# Altium footprint library mitosis.PcbLib: 14 footprints
Each footprint in its own frame and in the unit in brackets; x right, y up, seen from the top. Pads: shape width x height; smd on the part's side, far side on the other; paste and mask are expansions set on the pad; w line width, h text height; cw(c..) or ccw(c..) is an arc to the next point about the centre after c.
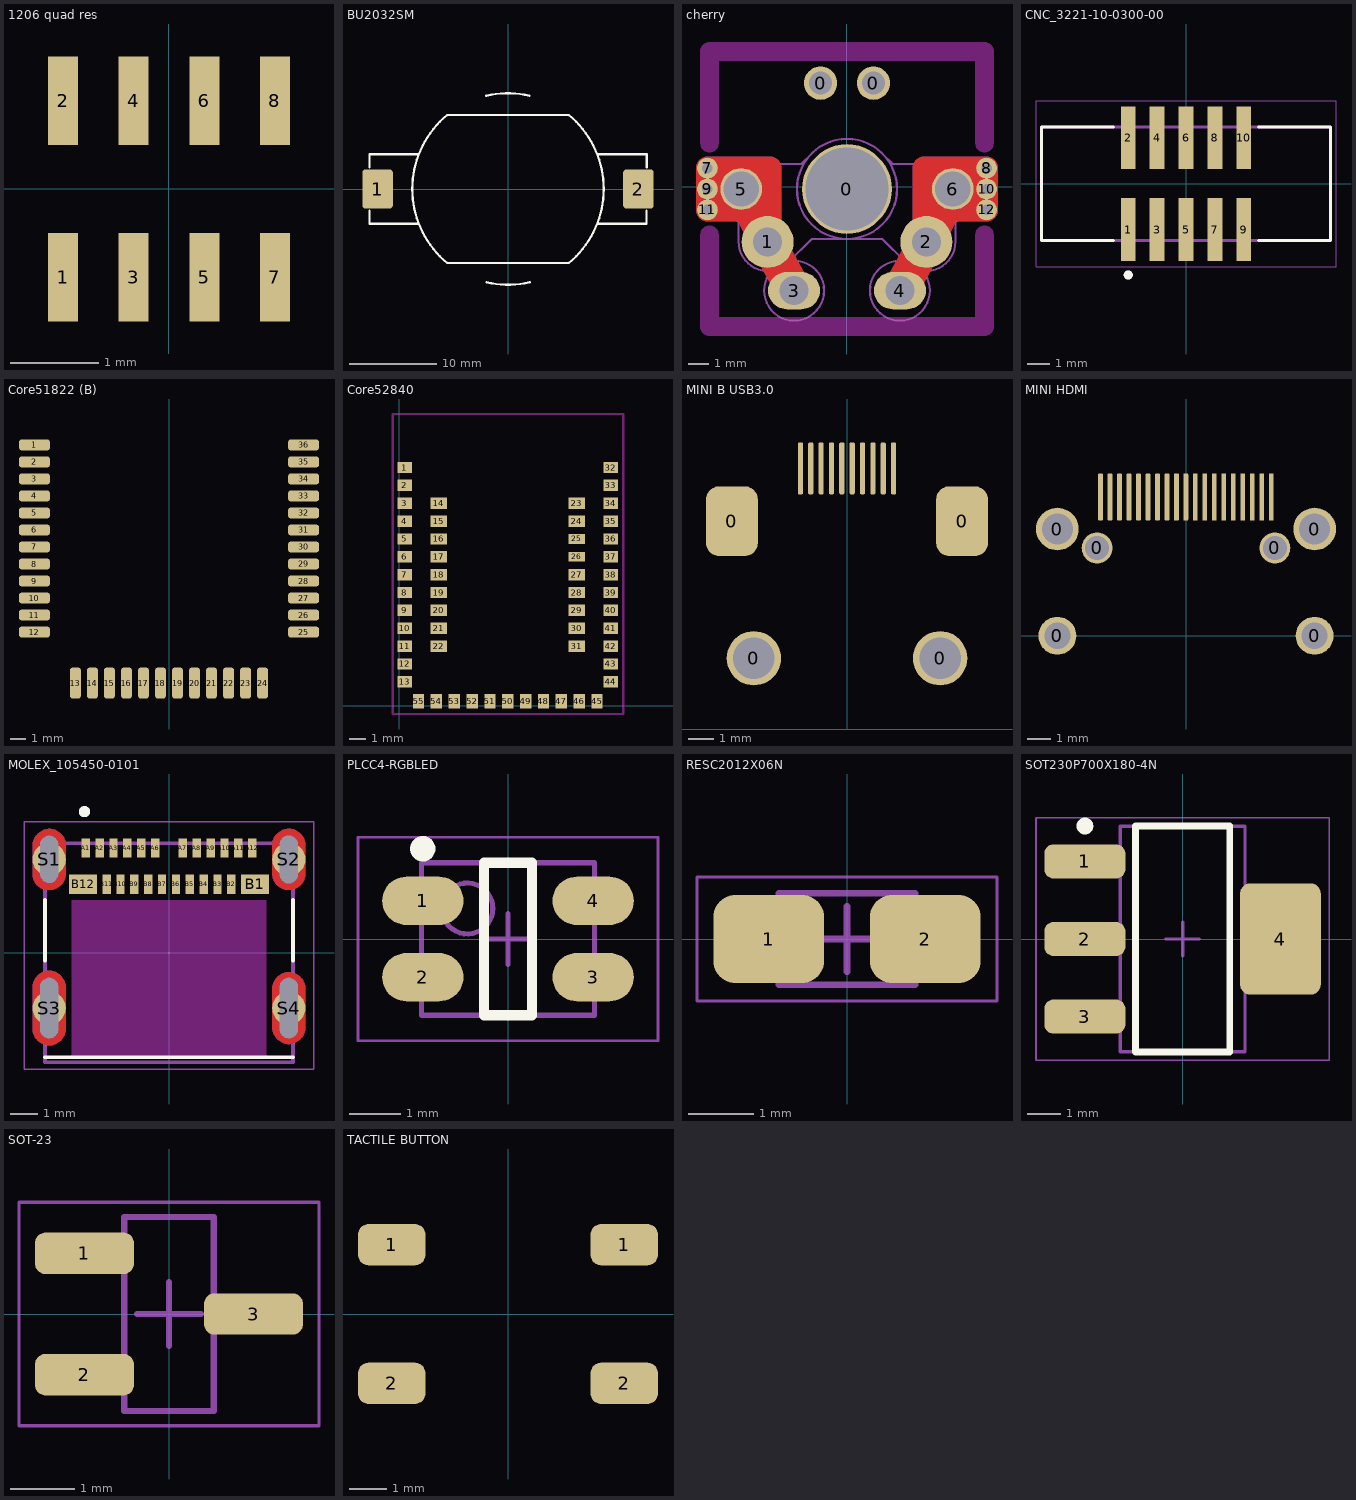
[diagram p0: the footprints below, top view; thin cyan lines are the x and y axes]

## 1206 quad res [mm]
pads (8):
  rect 0.34x1 smd: 1(-1.2,-1) 2(-1.2,1) 3(-0.4,-1) 4(-0.4,1) 5(0.4,-1) 6(0.4,1) 7(1.2,-1) 8(1.2,1)
3D body: height 1.1, standoff 0, extent -1.6,-0.8 1.6,0.8

## BU2032SM [mm] "Battery holder"
pads (2):
  rrect20% 3.5x4.5 smd paste-100: 1(-15,0) 2(15,0)
Top Overlay:
  lines w0.254: -15.93,-2.5 -15.93,-4 -10.287,-4 ; -15.93,2.5 -15.93,4 -10.287,4 ; -2.505,10.723 cw(c0,0) 2.483,10.728 ; -2.483,-10.728 ccw(c0,0) 2.505,-10.723 ; 10.287,-4 15.93,-4 15.93,-2.5 ; 10.287,4 15.95,4 15.95,2.5 ; -7,-8.5 cw(c0,0) -7,8.5 7,8.5 cw(c0,0) 7,-8.5 -7,-8.5
Top Paste:
  rectangle: 13.55,-2 14.87,-0.1
  rectangle: 13.55,0.1 14.87,2
  region: 16.45,2 15.13,2 15.13,0.1 16.45,0.1
  region: 16.45,-0.1 15.13,-0.1 15.13,-2 16.45,-2
  region: -13.55,2 -14.87,2 -14.87,0.1 -13.55,0.1
  region: -13.55,-0.1 -14.87,-0.1 -14.87,-2 -13.55,-2
  rectangle: -16.45,0.1 -15.13,2
  rectangle: -16.45,-2 -15.13,-0.1
3D body: height 4.6, standoff 0, extent -7,-8.5 7,8.5
3D body: height 4.7, standoff 1.5, extent -9.921,-9.98 10,9.98
3D body: height 4.6, standoff 0, extent -15.9,-4 15.9,4

## cherry [mm]
pads (15):
  round 1.6 hole 1.1: 0(-1.27,4.978) 0(1.27,4.978)
  round 4.3 hole 3.988: 0(0,-0.102)
  round 2.5 hole 1.4: 1(-3.81,-2.642) 2(3.81,-2.642)
  oval 2.5x1.8 hole 1.4: 3(-2.54,-4.978) 4(2.54,-4.978)
  round 2 hole 1.702: 5(-5.08,-0.102) 6(5.08,-0.102)
  round 1 hole 0.5 mask+0.05: 7(-6.7,0.898) 8(6.7,0.898) 9(-6.7,-0.102) 10(6.7,-0.102) 11(-6.7,-1.102) 12(6.7,-1.102)
Top Layer:
  lines w1.1: -6.7,-0.102 -5.08,-0.102 ; -4.3,-1.102 -6.7,-1.102 -6.7,0.898 -3.7,0.898 -3.7,-2.002 ; 3.7,-2.002 3.7,0.898 6.7,0.898 6.7,-1.102 4.3,-1.102 ; 5.08,-0.102 6.7,-0.102
  lines w1.7: -5.08,-0.102 -3.81,-2.642 -2.54,-4.978 ; 2.54,-4.978 3.81,-2.642 5.08,-0.102
Bottom Layer:
  lines w1.1: -6.7,-0.102 -5.08,-0.102 ; -4.3,-1.102 -6.7,-1.102 -6.7,0.898 -3.7,0.898 -3.7,-2.002 ; 3.7,-2.002 3.7,0.898 6.7,0.898 6.7,-1.102 4.3,-1.102 ; 5.08,-0.102 6.7,-0.102
  lines w1.7: -5.08,-0.102 -3.81,-2.642 -2.54,-4.978 ; 2.54,-4.978 3.81,-2.642 5.08,-0.102
Keep-Out Layer:
  board cut-out: -7,2.098 -7,6.498 -7,6.578 -6.939,6.725 -6.827,6.838 -6.68,6.898 -6.6,6.898 6.6,6.898 6.68,6.898 6.827,6.838 6.939,6.725 7,6.578 7,6.498 7,2.098 7,2.019 6.939,1.872 6.827,1.759 6.68,1.698 6.52,1.698 6.373,1.759 6.261,1.872 6.2,2.019 6.2,2.098 6.2,6.098 -6.2,6.098 -6.2,2.098 -6.2,2.019 -6.261,1.872 -6.373,1.759 -6.52,1.698 -6.68,1.698 -6.827,1.759 -6.939,1.872 -7,2.019
  board cut-out: -7,-2.302 -7,-6.702 -7,-6.781 -6.939,-6.928 -6.827,-7.041 -6.68,-7.102 -6.6,-7.102 6.6,-7.102 6.68,-7.102 6.827,-7.041 6.939,-6.928 7,-6.781 7,-6.702 7,-2.302 7,-2.222 6.939,-2.075 6.827,-1.962 6.68,-1.902 6.52,-1.902 6.373,-1.962 6.261,-2.075 6.2,-2.222 6.2,-2.302 6.2,-6.302 -6.2,-6.302 -6.2,-2.302 -6.2,-2.222 -6.261,-2.075 -6.373,-1.962 -6.52,-1.902 -6.68,-1.902 -6.827,-1.962 -6.939,-2.075 -7,-2.222
  text "CUTOUT" at -1.7,6.198 h0.6
  text "CUTOUT" at -1.7,-7.002 h0.6
Keep-Out Layer:
  lines w0.1: -7,-6.702 ccw(c-6.6,-6.702) -6.6,-7.102 6.6,-7.102 ccw(c6.6,-6.702) 7,-6.702 7,-2.302 ccw(c6.6,-2.302) 6.2,-2.302 6.2,-6.302 -6.2,-6.302 -6.2,-2.302 ccw(c-6.6,-2.302) -7,-2.302 -7,-6.702 ; -7,2.098 ccw(c-6.6,2.098) -6.2,2.098 -6.2,6.098 6.2,6.098 6.2,2.098 ccw(c6.6,2.098) 7,2.098 7,6.498 ccw(c6.6,6.498) 6.6,6.898 -6.6,6.898 ccw(c-6.6,6.498) -7,6.498 -7,2.098
Mechanical 3:
  circle w0.1: c-2.54,-4.978 r1.44
  circle w0.1: c-5.08,-0.102 r1.22
  lines w0.1: 0,-2.502 cw(c0,-0.099) 1.7,1.598 2.2,1.098 5.1,1.098 cw(c5.054,-0.122) 5.9,-1.002 5.2,-1.702 5.2,-2.62 cw(c3.808,-2.642) 2.8,-3.602 1.7,-2.502 0,-2.502
Mechanical 7:
  circle w0.1: c2.54,-4.978 r1.44
  circle w0.1: c5.08,-0.102 r1.22
  lines w0.1: -5.9,-1.002 cw(c-5.054,-0.122) -5.1,1.098 -2.2,1.098 -1.7,1.598 cw(c0,-0.099) 0,-2.502 -1.7,-2.502 -2.8,-3.602 cw(c-3.808,-2.642) -5.2,-2.62 -5.2,-1.702 -5.9,-1.002
3D body "white-keycap.step": height 23, standoff 11.5, extent -9,-9.102 9,8.898
3D body "switch.step": height 14.9, standoff -3, extent -7.82,-8.267 7.82,8.063
3D body "keycap.step": height 23, standoff 11.5, extent -9,-9.102 9,8.898
3D body "white-switch.step": height 14.9, standoff -3, extent -7.82,-8.267 7.82,8.063
3D body "black-keycap.step": height 23, standoff 11.5, extent -9,-9.102 9,8.898

## CNC_3221-10-0300-00 [mm]
pads (10):
  rect 0.65x2.76 smd: 1(-2.54,-2.02) 2(-2.54,2.02) 3(-1.27,-2.02) 4(-1.27,2.02) 5(0,-2.02) 6(0,2.02) 7(1.27,-2.02) 8(1.27,2.02) 9(2.54,-2.02) 10(2.54,2.02)
Top Overlay:
  circle w0.2: c-2.54,-4.019 r0.1
  lines w0.127: -3.185,-2.5 -6.35,-2.5 -6.35,2.5 -3.185,2.5 ; 3.185,-2.5 6.35,-2.5 6.35,2.5 3.185,2.5
Mechanical 13:
  circle w0.2: c-2.54,-4.019 r0.1
  lines w0.127: -6.35,-2.5 -6.35,2.5 6.35,2.5 6.35,-2.5 -6.35,-2.5
Mechanical 15:
  lines w0.05: -6.6,-3.65 -6.6,3.65 6.6,3.65 6.6,-3.65 -6.6,-3.65

## Core51822 (B) [mm]
pads (36):
  rrect50% 2x0.7 smd: 1(-8.7,-5.6) 2(-8.7,-6.7) 3(-8.7,-7.8) 4(-8.7,-8.9) 5(-8.7,-10) 6(-8.7,-11.1) 7(-8.7,-12.2) 8(-8.7,-13.3) 9(-8.7,-14.4) 10(-8.7,-15.5) 11(-8.7,-16.6) 12(-8.7,-17.7) 25(8.7,-17.7) 26(8.7,-16.6) 27(8.7,-15.5) 28(8.7,-14.4) 29(8.7,-13.3) 30(8.7,-12.2) 31(8.7,-11.1) 32(8.7,-10) 33(8.7,-8.9) 34(8.7,-7.8) 35(8.7,-6.7) 36(8.7,-5.6)
  rrect50% 0.7x2 smd: 13(-6.05,-21) 14(-4.95,-21) 15(-3.85,-21) 16(-2.75,-21) 17(-1.65,-21) 18(-0.55,-21) 19(0.55,-21) 20(1.65,-21) 21(2.75,-21) 22(3.85,-21) 23(4.95,-21) 24(6.05,-21)
3D body: height 1.8, standoff 1, extent -2.3,-13.8 3.7,-7.8
3D body: height 1, standoff 0, extent -8.5,-20.8 8.5,0

## Core52840 [mm]
pads (55):
  rect 0.9x0.7 smd: 1(0.337,14.684) 2(0.337,13.584) 3(0.337,12.484) 4(0.337,11.384) 5(0.337,10.284) 6(0.337,9.184) 7(0.337,8.084) 8(0.337,6.984) 9(0.337,5.884) 10(0.337,4.784) 11(0.337,3.684) 12(0.337,2.584) 13(0.337,1.484) 32(13.037,14.684) 33(13.037,13.584) 34(13.037,12.484) 35(13.037,11.384) 36(13.037,10.284) 37(13.037,9.184) 38(13.037,8.084) 39(13.037,6.984) 40(13.037,5.884) 41(13.037,4.784) 42(13.037,3.684) 43(13.037,2.584) 44(13.037,1.484)
  rect 1x0.7 smd: 14(2.437,12.484) 15(2.437,11.384) 16(2.437,10.284) 17(2.437,9.184) 18(2.437,8.084) 19(2.437,6.984) 20(2.437,5.884) 21(2.437,4.784) 22(2.437,3.684) 23(10.937,12.484) 24(10.937,11.384) 27(10.937,8.084) 28(10.937,6.984) 29(10.937,5.884) 30(10.937,4.784) 31(10.937,3.684)
  rect 1x0.6 smd: 25(10.937,10.284) 26(10.937,9.184)
  rect 0.7x0.9 smd: 45(12.187,0.284) 46(11.087,0.284) 47(9.987,0.284) 48(8.887,0.284) 49(7.787,0.284) 50(6.687,0.284) 51(5.587,0.284) 52(4.487,0.284) 53(3.387,0.284) 54(2.287,0.284) 55(1.187,0.284)
Top Solder:
  rectangle: 12.052,9.934 12.582,15.354
  rectangle: 3.397,14.894 12.582,15.354
  rectangle: 0.797,0.774 10.827,1.214
  rectangle: 0.797,14.889 2.467,15.339
  rectangle: 0.797,0.774 1.232,15.244
Keep-Out Layer:
  lines w0.127: -0.4,-0.5 -0.4,17.984 13.8,17.984 13.8,-0.5 -0.4,-0.5

## MINI B USB3.0 [mm] "USB2070"
pads (14):
  rrect50% 2x2.7 smd mask+0.05: 0(-4.45,8.05) 0(4.45,8.05)
  round 2.1 hole 1.6: 0(-3.6,2.75) 0(3.6,2.75)
  rrect50% 0.2x2 smd mask+0.05: 1(-1.8,10.09) 2(-1.4,10.09) 3(-1,10.09) 4(-0.6,10.09) 5(-0.2,10.09) 6(0.2,10.09) 7(0.6,10.09) 8(1,10.09) 9(1.4,10.09) 10(1.8,10.09)
3D body "miniusb.step": height 3.75, standoff -0.65, extent -4.85,0 4.85,9.9

## MINI HDMI [mm]
pads (25):
  round 1.6 hole 1.1: 0(-5.425,0) 0(5.425,0)
  round 1.8 hole 1.3: 0(-5.425,4.5) 0(5.425,4.5)
  round 1.3 hole 1 mask+0.05: 0(-3.75,3.7) 0(3.75,3.7)
  rrect50% 0.2x2 smd mask+0.05: 1(3.595,5.85) 2(3.195,5.85) 3(2.795,5.85) 4(2.395,5.85) 5(1.995,5.85) 6(1.595,5.85) 7(1.195,5.85) 8(0.795,5.85) 9(0.395,5.85) 10(-0.005,5.85) 11(-0.405,5.85) 12(-0.805,5.85) 13(-1.205,5.85) 14(-1.605,5.85) 15(-2.005,5.85) 16(-2.405,5.85) 17(-2.805,5.85) 18(-3.205,5.85) 19(-3.605,5.85)
3D body "Download_STP_685119136923.stp": height 3.3, standoff -2.15, extent -5.625,-2 5.625,5.902

## MOLEX_105450-0101 [mm]
pads (28):
  rect 0.3x0.7 smd: A1(-3,3.77) A2(-2.5,3.77) A3(-2,3.77) A4(-1.5,3.77) A5(-1,3.77) A6(-0.5,3.77) A7(0.5,3.77) A8(1,3.77) A9(1.5,3.77) A10(2,3.77) A11(2.5,3.77) A12(3,3.77) B2(2.25,2.47) B3(1.75,2.47) B4(1.25,2.47) B5(0.75,2.47) B6(0.25,2.47) B7(-0.25,2.47) B8(-0.75,2.47) B9(-1.25,2.47) B10(-1.75,2.47) B11(-2.25,2.47)
  rect 1x0.7 smd: B1(3.1,2.47) B12(-3.1,2.47)
  round 1.2 hole 0.65 slot 1.7 at 90 deg mask+0: S1(-4.32,3.36)
  round 1.2 hole 0.65 slot 1.725 at 90 deg mask+0: S2(4.32,3.36)
  round 1.2 hole 0.65 slot 2.175 at 90 deg mask+0: S3(-4.32,-2) S4(4.32,-2)
Top Layer:
  region: 4.35,-0.702 4.382,-0.706 4.414,-0.711 4.446,-0.718 4.478,-0.727 4.509,-0.737 4.539,-0.749 4.569,-0.763 4.598,-0.778 4.626,-0.795 4.654,-0.813 4.68,-0.832 4.705,-0.853 4.73,-0.875 4.752,-0.898 4.774,-0.923 4.795,-0.949 4.814,-0.975 4.831,-1.003 4.847,-1.031 4.862,-1.061 4.875,-1.091 4.886,-1.121 4.896,-1.153 4.904,-1.184 4.911,-1.216 4.916,-1.249 4.919,-1.281 4.92,-1.314 4.92,-1.35 4.92,-2.65 4.92,-2.686 4.919,-2.719 4.916,-2.751 4.911,-2.784 4.904,-2.816 4.896,-2.847 4.886,-2.879 4.875,-2.909 4.862,-2.939 4.847,-2.969 4.831,-2.997 4.814,-3.025 4.795,-3.051 4.774,-3.077 4.752,-3.102 4.73,-3.125 4.705,-3.147 4.68,-3.168 4.654,-3.187 4.626,-3.205 4.598,-3.222 4.569,-3.237 4.539,-3.251 4.509,-3.263 4.478,-3.273 4.446,-3.282 4.414,-3.289 4.382,-3.294 4.35,-3.298 4.32,-3.3 4.29,-3.298 4.258,-3.294 4.226,-3.289 4.194,-3.282 4.162,-3.273 4.131,-3.263 4.101,-3.251 4.071,-3.237 4.042,-3.222 4.014,-3.205 3.986,-3.187 3.96,-3.168 3.935,-3.147 3.91,-3.125 3.888,-3.102 3.866,-3.077 3.845,-3.051 3.826,-3.025 3.809,-2.997 3.793,-2.969 3.778,-2.939 3.765,-2.909 3.754,-2.879 3.744,-2.847 3.736,-2.816 3.729,-2.784 3.724,-2.751 3.721,-2.719 3.72,-2.686 3.72,-2.65 3.72,-1.35 3.72,-1.314 3.721,-1.281 3.724,-1.249 3.729,-1.216 3.736,-1.184 3.744,-1.153 3.754,-1.121 3.765,-1.091 3.778,-1.061 3.793,-1.031 3.809,-1.003 3.826,-0.975 3.845,-0.949 3.866,-0.923 3.888,-0.898 3.91,-0.875 3.935,-0.853 3.96,-0.832 3.986,-0.813 4.014,-0.795 4.042,-0.778 4.071,-0.763 4.101,-0.749 4.131,-0.737 4.162,-0.727 4.194,-0.718 4.226,-0.711 4.258,-0.706 4.29,-0.702 4.32,-0.7
  region: -4.29,-0.652 -4.258,-0.656 -4.226,-0.661 -4.194,-0.668 -4.162,-0.677 -4.131,-0.687 -4.101,-0.699 -4.071,-0.713 -4.042,-0.728 -4.014,-0.745 -3.986,-0.763 -3.96,-0.782 -3.935,-0.803 -3.91,-0.825 -3.888,-0.848 -3.866,-0.873 -3.845,-0.899 -3.826,-0.925 -3.809,-0.953 -3.793,-0.981 -3.778,-1.011 -3.765,-1.041 -3.754,-1.071 -3.744,-1.103 -3.736,-1.134 -3.729,-1.166 -3.724,-1.199 -3.721,-1.231 -3.72,-1.264 -3.72,-1.3 -3.72,-2.7 -3.72,-2.736 -3.721,-2.769 -3.724,-2.801 -3.729,-2.834 -3.736,-2.866 -3.744,-2.897 -3.754,-2.929 -3.765,-2.959 -3.778,-2.989 -3.793,-3.019 -3.809,-3.047 -3.826,-3.075 -3.845,-3.101 -3.866,-3.127 -3.888,-3.152 -3.91,-3.175 -3.935,-3.197 -3.96,-3.218 -3.986,-3.237 -4.014,-3.255 -4.042,-3.272 -4.071,-3.287 -4.101,-3.301 -4.131,-3.313 -4.162,-3.323 -4.194,-3.332 -4.226,-3.339 -4.258,-3.344 -4.29,-3.348 -4.32,-3.35 -4.35,-3.348 -4.382,-3.344 -4.414,-3.339 -4.446,-3.332 -4.478,-3.323 -4.509,-3.313 -4.539,-3.301 -4.569,-3.287 -4.598,-3.272 -4.626,-3.255 -4.654,-3.237 -4.68,-3.218 -4.705,-3.197 -4.73,-3.175 -4.752,-3.152 -4.774,-3.127 -4.795,-3.101 -4.814,-3.075 -4.831,-3.047 -4.847,-3.019 -4.862,-2.989 -4.875,-2.959 -4.886,-2.929 -4.896,-2.897 -4.904,-2.866 -4.911,-2.834 -4.916,-2.801 -4.919,-2.769 -4.92,-2.736 -4.92,-2.7 -4.92,-1.3 -4.92,-1.264 -4.919,-1.231 -4.916,-1.199 -4.911,-1.166 -4.904,-1.134 -4.896,-1.103 -4.886,-1.071 -4.875,-1.041 -4.862,-1.011 -4.847,-0.981 -4.831,-0.953 -4.814,-0.925 -4.795,-0.899 -4.774,-0.873 -4.752,-0.848 -4.73,-0.825 -4.705,-0.803 -4.68,-0.782 -4.654,-0.763 -4.626,-0.745 -4.598,-0.728 -4.569,-0.713 -4.539,-0.699 -4.509,-0.687 -4.478,-0.677 -4.446,-0.668 -4.414,-0.661 -4.382,-0.656 -4.35,-0.652 -4.32,-0.65
  region: 4.351,4.459 4.383,4.457 4.414,4.453 4.445,4.447 4.475,4.44 4.505,4.431 4.535,4.42 4.564,4.408 4.592,4.395 4.62,4.38 4.647,4.363 4.673,4.345 4.698,4.326 4.721,4.306 4.744,4.284 4.766,4.261 4.786,4.238 4.805,4.213 4.823,4.187 4.84,4.16 4.855,4.132 4.868,4.104 4.88,4.075 4.891,4.045 4.9,4.015 4.907,3.985 4.913,3.954 4.917,3.923 4.919,3.891 4.92,3.86 4.92,2.86 4.919,2.829 4.917,2.797 4.913,2.766 4.907,2.735 4.9,2.705 4.891,2.675 4.88,2.645 4.868,2.616 4.855,2.588 4.84,2.56 4.823,2.533 4.805,2.507 4.786,2.482 4.766,2.459 4.744,2.436 4.721,2.414 4.698,2.394 4.673,2.375 4.647,2.357 4.62,2.34 4.592,2.325 4.564,2.312 4.535,2.3 4.505,2.289 4.475,2.28 4.445,2.273 4.414,2.267 4.383,2.263 4.351,2.261 4.32,2.26 4.289,2.261 4.257,2.263 4.226,2.267 4.195,2.273 4.165,2.28 4.135,2.289 4.105,2.3 4.076,2.312 4.048,2.325 4.02,2.34 3.993,2.357 3.967,2.375 3.942,2.394 3.919,2.414 3.896,2.436 3.874,2.459 3.854,2.482 3.835,2.507 3.817,2.533 3.8,2.56 3.785,2.588 3.772,2.616 3.76,2.645 3.749,2.675 3.74,2.705 3.733,2.735 3.727,2.766 3.723,2.797 3.721,2.829 3.72,2.86 3.72,3.86 3.721,3.891 3.723,3.923 3.727,3.954 3.733,3.985 3.74,4.015 3.749,4.045 3.76,4.075 3.772,4.104 3.785,4.132 3.8,4.16 3.817,4.187 3.835,4.213 3.854,4.238 3.874,4.261 3.896,4.284 3.919,4.306 3.942,4.326 3.967,4.345 3.993,4.363 4.02,4.38 4.048,4.395 4.076,4.408 4.105,4.42 4.135,4.431 4.165,4.44 4.195,4.447 4.226,4.453 4.257,4.457 4.289,4.459 4.32,4.46
  region: -4.289,4.459 -4.257,4.457 -4.226,4.453 -4.195,4.447 -4.165,4.44 -4.135,4.431 -4.105,4.42 -4.076,4.408 -4.048,4.395 -4.02,4.38 -3.993,4.363 -3.967,4.345 -3.942,4.326 -3.919,4.306 -3.896,4.284 -3.874,4.261 -3.854,4.238 -3.835,4.213 -3.817,4.187 -3.8,4.16 -3.785,4.132 -3.772,4.104 -3.76,4.075 -3.749,4.045 -3.74,4.015 -3.733,3.985 -3.727,3.954 -3.723,3.923 -3.721,3.891 -3.72,3.86 -3.72,2.86 -3.721,2.829 -3.723,2.797 -3.727,2.766 -3.733,2.735 -3.74,2.705 -3.749,2.675 -3.76,2.645 -3.772,2.616 -3.785,2.588 -3.8,2.56 -3.817,2.533 -3.835,2.507 -3.854,2.482 -3.874,2.459 -3.896,2.436 -3.919,2.414 -3.942,2.394 -3.967,2.375 -3.993,2.357 -4.02,2.34 -4.048,2.325 -4.076,2.312 -4.105,2.3 -4.135,2.289 -4.165,2.28 -4.195,2.273 -4.226,2.267 -4.257,2.263 -4.289,2.261 -4.32,2.26 -4.355,2.26 -4.385,2.261 -4.415,2.264 -4.445,2.268 -4.474,2.274 -4.504,2.282 -4.532,2.291 -4.561,2.301 -4.588,2.313 -4.615,2.327 -4.641,2.342 -4.667,2.358 -4.691,2.375 -4.715,2.394 -4.738,2.414 -4.759,2.435 -4.779,2.457 -4.799,2.481 -4.816,2.505 -4.833,2.53 -4.848,2.556 -4.862,2.583 -4.875,2.61 -4.886,2.638 -4.895,2.667 -4.903,2.696 -4.91,2.725 -4.915,2.755 -4.918,2.785 -4.92,2.81 -4.92,3.81 -4.92,3.846 -4.919,3.879 -4.916,3.911 -4.911,3.944 -4.904,3.976 -4.896,4.007 -4.886,4.039 -4.875,4.069 -4.862,4.099 -4.847,4.129 -4.831,4.157 -4.814,4.185 -4.795,4.211 -4.774,4.237 -4.752,4.262 -4.73,4.285 -4.705,4.307 -4.68,4.328 -4.654,4.347 -4.626,4.365 -4.598,4.382 -4.569,4.397 -4.539,4.411 -4.509,4.423 -4.478,4.433 -4.446,4.442 -4.414,4.449 -4.382,4.454 -4.35,4.458 -4.32,4.46
Bottom Layer:
  region: 4.35,-0.702 4.382,-0.706 4.414,-0.711 4.446,-0.718 4.478,-0.727 4.509,-0.737 4.539,-0.749 4.569,-0.763 4.598,-0.778 4.626,-0.795 4.654,-0.813 4.68,-0.832 4.705,-0.853 4.73,-0.875 4.752,-0.898 4.774,-0.923 4.795,-0.949 4.814,-0.975 4.831,-1.003 4.847,-1.031 4.862,-1.061 4.875,-1.091 4.886,-1.121 4.896,-1.153 4.904,-1.184 4.911,-1.216 4.916,-1.249 4.919,-1.281 4.92,-1.314 4.92,-1.35 4.92,-2.65 4.92,-2.686 4.919,-2.719 4.916,-2.751 4.911,-2.784 4.904,-2.816 4.896,-2.847 4.886,-2.879 4.875,-2.909 4.862,-2.939 4.847,-2.969 4.831,-2.997 4.814,-3.025 4.795,-3.051 4.774,-3.077 4.752,-3.102 4.73,-3.125 4.705,-3.147 4.68,-3.168 4.654,-3.187 4.626,-3.205 4.598,-3.222 4.569,-3.237 4.539,-3.251 4.509,-3.263 4.478,-3.273 4.446,-3.282 4.414,-3.289 4.382,-3.294 4.35,-3.298 4.32,-3.3 4.29,-3.298 4.258,-3.294 4.226,-3.289 4.194,-3.282 4.162,-3.273 4.131,-3.263 4.101,-3.251 4.071,-3.237 4.042,-3.222 4.014,-3.205 3.986,-3.187 3.96,-3.168 3.935,-3.147 3.91,-3.125 3.888,-3.102 3.866,-3.077 3.845,-3.051 3.826,-3.025 3.809,-2.997 3.793,-2.969 3.778,-2.939 3.765,-2.909 3.754,-2.879 3.744,-2.847 3.736,-2.816 3.729,-2.784 3.724,-2.751 3.721,-2.719 3.72,-2.686 3.72,-2.65 3.72,-1.35 3.72,-1.314 3.721,-1.281 3.724,-1.249 3.729,-1.216 3.736,-1.184 3.744,-1.153 3.754,-1.121 3.765,-1.091 3.778,-1.061 3.793,-1.031 3.809,-1.003 3.826,-0.975 3.845,-0.949 3.866,-0.923 3.888,-0.898 3.91,-0.875 3.935,-0.853 3.96,-0.832 3.986,-0.813 4.014,-0.795 4.042,-0.778 4.071,-0.763 4.101,-0.749 4.131,-0.737 4.162,-0.727 4.194,-0.718 4.226,-0.711 4.258,-0.706 4.29,-0.702 4.32,-0.7
  region: -4.29,-0.652 -4.258,-0.656 -4.226,-0.661 -4.194,-0.668 -4.162,-0.677 -4.131,-0.687 -4.101,-0.699 -4.071,-0.713 -4.042,-0.728 -4.014,-0.745 -3.986,-0.763 -3.96,-0.782 -3.935,-0.803 -3.91,-0.825 -3.888,-0.848 -3.866,-0.873 -3.845,-0.899 -3.826,-0.925 -3.809,-0.953 -3.793,-0.981 -3.778,-1.011 -3.765,-1.041 -3.754,-1.071 -3.744,-1.103 -3.736,-1.134 -3.729,-1.166 -3.724,-1.199 -3.721,-1.231 -3.72,-1.264 -3.72,-1.3 -3.72,-2.7 -3.72,-2.736 -3.721,-2.769 -3.724,-2.801 -3.729,-2.834 -3.736,-2.866 -3.744,-2.897 -3.754,-2.929 -3.765,-2.959 -3.778,-2.989 -3.793,-3.019 -3.809,-3.047 -3.826,-3.075 -3.845,-3.101 -3.866,-3.127 -3.888,-3.152 -3.91,-3.175 -3.935,-3.197 -3.96,-3.218 -3.986,-3.237 -4.014,-3.255 -4.042,-3.272 -4.071,-3.287 -4.101,-3.301 -4.131,-3.313 -4.162,-3.323 -4.194,-3.332 -4.226,-3.339 -4.258,-3.344 -4.29,-3.348 -4.32,-3.35 -4.35,-3.348 -4.382,-3.344 -4.414,-3.339 -4.446,-3.332 -4.478,-3.323 -4.509,-3.313 -4.539,-3.301 -4.569,-3.287 -4.598,-3.272 -4.626,-3.255 -4.654,-3.237 -4.68,-3.218 -4.705,-3.197 -4.73,-3.175 -4.752,-3.152 -4.774,-3.127 -4.795,-3.101 -4.814,-3.075 -4.831,-3.047 -4.847,-3.019 -4.862,-2.989 -4.875,-2.959 -4.886,-2.929 -4.896,-2.897 -4.904,-2.866 -4.911,-2.834 -4.916,-2.801 -4.919,-2.769 -4.92,-2.736 -4.92,-2.7 -4.92,-1.3 -4.92,-1.264 -4.919,-1.231 -4.916,-1.199 -4.911,-1.166 -4.904,-1.134 -4.896,-1.103 -4.886,-1.071 -4.875,-1.041 -4.862,-1.011 -4.847,-0.981 -4.831,-0.953 -4.814,-0.925 -4.795,-0.899 -4.774,-0.873 -4.752,-0.848 -4.73,-0.825 -4.705,-0.803 -4.68,-0.782 -4.654,-0.763 -4.626,-0.745 -4.598,-0.728 -4.569,-0.713 -4.539,-0.699 -4.509,-0.687 -4.478,-0.677 -4.446,-0.668 -4.414,-0.661 -4.382,-0.656 -4.35,-0.652 -4.32,-0.65
  region: 4.351,4.459 4.383,4.457 4.414,4.453 4.445,4.447 4.475,4.44 4.505,4.431 4.535,4.42 4.564,4.408 4.592,4.395 4.62,4.38 4.647,4.363 4.673,4.345 4.698,4.326 4.721,4.306 4.744,4.284 4.766,4.261 4.786,4.238 4.805,4.213 4.823,4.187 4.84,4.16 4.855,4.132 4.868,4.104 4.88,4.075 4.891,4.045 4.9,4.015 4.907,3.985 4.913,3.954 4.917,3.923 4.919,3.891 4.92,3.86 4.92,2.86 4.919,2.829 4.917,2.797 4.913,2.766 4.907,2.735 4.9,2.705 4.891,2.675 4.88,2.645 4.868,2.616 4.855,2.588 4.84,2.56 4.823,2.533 4.805,2.507 4.786,2.482 4.766,2.459 4.744,2.436 4.721,2.414 4.698,2.394 4.673,2.375 4.647,2.357 4.62,2.34 4.592,2.325 4.564,2.312 4.535,2.3 4.505,2.289 4.475,2.28 4.445,2.273 4.414,2.267 4.383,2.263 4.351,2.261 4.32,2.26 4.289,2.261 4.257,2.263 4.226,2.267 4.195,2.273 4.165,2.28 4.135,2.289 4.105,2.3 4.076,2.312 4.048,2.325 4.02,2.34 3.993,2.357 3.967,2.375 3.942,2.394 3.919,2.414 3.896,2.436 3.874,2.459 3.854,2.482 3.835,2.507 3.817,2.533 3.8,2.56 3.785,2.588 3.772,2.616 3.76,2.645 3.749,2.675 3.74,2.705 3.733,2.735 3.727,2.766 3.723,2.797 3.721,2.829 3.72,2.86 3.72,3.86 3.721,3.891 3.723,3.923 3.727,3.954 3.733,3.985 3.74,4.015 3.749,4.045 3.76,4.075 3.772,4.104 3.785,4.132 3.8,4.16 3.817,4.187 3.835,4.213 3.854,4.238 3.874,4.261 3.896,4.284 3.919,4.306 3.942,4.326 3.967,4.345 3.993,4.363 4.02,4.38 4.048,4.395 4.076,4.408 4.105,4.42 4.135,4.431 4.165,4.44 4.195,4.447 4.226,4.453 4.257,4.457 4.289,4.459 4.32,4.46
  region: -4.289,4.459 -4.257,4.457 -4.226,4.453 -4.195,4.447 -4.165,4.44 -4.135,4.431 -4.105,4.42 -4.076,4.408 -4.048,4.395 -4.02,4.38 -3.993,4.363 -3.967,4.345 -3.942,4.326 -3.919,4.306 -3.896,4.284 -3.874,4.261 -3.854,4.238 -3.835,4.213 -3.817,4.187 -3.8,4.16 -3.785,4.132 -3.772,4.104 -3.76,4.075 -3.749,4.045 -3.74,4.015 -3.733,3.985 -3.727,3.954 -3.723,3.923 -3.721,3.891 -3.72,3.86 -3.72,2.86 -3.721,2.829 -3.723,2.797 -3.727,2.766 -3.733,2.735 -3.74,2.705 -3.749,2.675 -3.76,2.645 -3.772,2.616 -3.785,2.588 -3.8,2.56 -3.817,2.533 -3.835,2.507 -3.854,2.482 -3.874,2.459 -3.896,2.436 -3.919,2.414 -3.942,2.394 -3.967,2.375 -3.993,2.357 -4.02,2.34 -4.048,2.325 -4.076,2.312 -4.105,2.3 -4.135,2.289 -4.165,2.28 -4.195,2.273 -4.226,2.267 -4.257,2.263 -4.289,2.261 -4.32,2.26 -4.355,2.26 -4.385,2.261 -4.415,2.264 -4.445,2.268 -4.474,2.274 -4.504,2.282 -4.532,2.291 -4.561,2.301 -4.588,2.313 -4.615,2.327 -4.641,2.342 -4.667,2.358 -4.691,2.375 -4.715,2.394 -4.738,2.414 -4.759,2.435 -4.779,2.457 -4.799,2.481 -4.816,2.505 -4.833,2.53 -4.848,2.556 -4.862,2.583 -4.875,2.61 -4.886,2.638 -4.895,2.667 -4.903,2.696 -4.91,2.725 -4.915,2.755 -4.918,2.785 -4.92,2.81 -4.92,3.81 -4.92,3.846 -4.919,3.879 -4.916,3.911 -4.911,3.944 -4.904,3.976 -4.896,4.007 -4.886,4.039 -4.875,4.069 -4.862,4.099 -4.847,4.129 -4.831,4.157 -4.814,4.185 -4.795,4.211 -4.774,4.237 -4.752,4.262 -4.73,4.285 -4.705,4.307 -4.68,4.328 -4.654,4.347 -4.626,4.365 -4.598,4.382 -4.569,4.397 -4.539,4.411 -4.509,4.423 -4.478,4.433 -4.446,4.442 -4.414,4.449 -4.382,4.454 -4.35,4.458 -4.32,4.46
Top Overlay:
  circle w0.2: c-3.048,5.08 r0.1
  lines w0.127: -4.47,-3.77 4.47,-3.77 ; -4.47,-0.3 -4.47,1.9 ; 4.47,-0.3 4.47,1.9
Top Solder:
  drawing of 4 lines, arcs and shapes, not listed
Bottom Solder:
  drawing of 4 lines, arcs and shapes, not listed
Keep-Out Layer:
  region: 3.5,-3.77 -3.5,-3.77 -3.5,1.88 3.5,1.88
Mechanical 13:
  circle w0.2: c-3.048,5.08 r0.1
  lines w0.127: -4.47,-3.95 -4.47,3.95 4.47,3.95 4.47,-3.95 -4.47,-3.95
Mechanical 15:
  lines w0.05: -5.22,-4.2 -5.22,4.71 5.22,4.71 5.22,-4.2 -5.22,-4.2
3D body "1054500101--3DModel-STEP-1.STEP": height 3.2, standoff -0.9, extent -4.47,-3.905 4.47,3.995

## PLCC4-RGBLED [mm]
height 2.1
pads (4):
  oval 1.6x0.95 smd: 1(-1.675,0.75) 2(-1.675,-0.75) 3(1.675,-0.75) 4(1.675,0.75)
Top Overlay:
  circle w0.25: c-1.675,1.775 r0.125
  lines w0.2: -0.475,-1.5 0.475,-1.5 0.475,1.5 -0.475,1.5 -0.475,-1.5
Mechanical 13:
  circle w0.1: c-0.8,0.6 r0.5
  lines w0.1: -1.7,-1.5 1.7,-1.5 1.7,1.5 -1.7,1.5 -1.7,-1.5
Mechanical 15:
  lines w0.05: -2.95,-2 2.95,-2 2.95,2 -2.95,2 -2.95,-2
  lines w0.1: -0.5,0 0.5,0 ; 0,-0.5 0,0.5
3D body: height 2.1, standoff 0, extent -1.7,-1.5 1.7,1.5
3D body: height 2.2, standoff 0, extent -0.992,-0.998 1,0.998

## RESC2012X06N [mm] "Chip Resistor, 2-Leads, Body 2.00x1.25mm, IPC Medium Density"
height 0.55
pads (2):
  rrect50% 1.7x1.35 smd: 1(-1.2,0) 2(1.2,0)
Mechanical 13:
  lines w0.1: -1.05,-0.7 1.05,-0.7 1.05,0.7 -1.05,0.7 -1.05,-0.7
Mechanical 15:
  lines w0.05: -2.3,-0.95 2.3,-0.95 2.3,0.95 -2.3,0.95 -2.3,-0.95
  lines w0.1: -0.5,0 0.5,0 ; 0,-0.5 0,0.5
3D body: height 0.55, standoff 0, extent 0.6,-0.7 1.05,0.7
3D body: height 0.55, standoff 0, extent -1.05,-0.7 -0.6,0.7
3D body: height 0.55, standoff 0, extent -0.6,-0.7 0.6,0.7

## SOT230P700X180-4N [mm] "SOT223, 4-Leads, Body 6.50x7.00mm (avg), Pitch 2.30mm, IPC Medium Density"
height 1.8
pads (4):
  rrect50% 2.4x1 smd: 1(-2.9,2.3) 2(-2.9,0) 3(-2.9,-2.3)
  rrect25% 2.4x3.3 smd: 4(2.9,0)
Top Overlay:
  circle w0.25: c-2.9,3.35 r0.125
  lines w0.2: -1.4,-3.35 -1.4,3.35 1.4,3.35 1.4,-3.35 -1.4,-3.35
Mechanical 13:
  lines w0.1: -1.85,-3.35 -1.85,3.35 1.85,3.35 1.85,-3.35 -1.85,-3.35
Mechanical 15:
  lines w0.05: -4.35,-3.6 -4.35,3.6 4.35,3.6 4.35,-3.6 -4.35,-3.6
  lines w0.1: -0.5,0 0.5,0 ; 0,-0.5 0,0.5
3D body: height 1.8, standoff 0.02, extent -1.85,-3.35 1.85,3.35

## SOT-23 [mm] "SOT23, 3-Leads, Body 2.92x3.10mm, Pitch 0.95mm, IPC Medium Density"
height 1.12
pads (3):
  rrect50% 1.55x0.65 smd: 1(-1.325,0.95) 2(-1.325,-0.95) 3(1.325,0)
Mechanical 13:
  lines w0.1: -0.7,-1.52 -0.7,1.52 0.7,1.52 0.7,-1.52 -0.7,-1.52
Mechanical 15:
  lines w0.05: -2.35,-1.75 -2.35,1.75 2.35,1.75 2.35,-1.75 -2.35,-1.75
  lines w0.1: -0.5,0 0.5,0 ; 0,-0.5 0,0.5
3D body: height 1.12, standoff 0.01, extent -0.7,-1.52 0.7,1.52

## TACTILE BUTTON [mm]
pads (4):
  rrect50% 1.8x1.1 smd: 1(-3.1,1.85) 1(3.1,1.85) 2(-3.1,-1.85) 2(3.1,-1.85)
3D body: height 1.2, standoff 0, extent -2.6,-2.6 2.6,2.6
3D body: height 1.6, standoff 0, extent -1.091,-1.098 1.1,1.098